# Altium integrated library CbyP.IntLib: 1144 symbols (part 2 of 6) (continued)
## RC0402FR-07470KL
designator R?, comment 470K
62.5mW 470kΩ 50V Thick Film Resistor ±100ppm/℃ ±1% 0402 Chip Resistor - Surface Mount RoHS; Manufacturer: YAGEO; Mfr.Part #: RC0402FR-07470KL; Package: 0402; LCSC Part #: C137976; DigiKey Part Number: 311-470KLRTR-ND; ComponentLink1Description: Link; ComponentLink1URL: https://www.lcsc.com/product-detail/C137976.html?s_z=n_470K; ComponentLink2Description: Link 1; ComponentLink2URL: https://www.digikey.com/en/products/detail/yageo/RC0402FR-07470KL/726618?s=N4IgTCBcDaIEoGEAMAWJYBicC0SDsKeSA0gDIgC6AvkA
footprint RES-0402
pins: 1, 2

## RC0402FR-07475RL
designator R?, comment 475R
62.5mW Thick Film Resistor 50V ±100ppm/℃ ±1% 475Ω 0402 Chip Resistor - Surface Mount ROHS; Manufacturer: YAGEO; Mfr.Part #: RC0402FR-07475RL; Package: 0402; LCSC Part #: C137975; DigiKey Part Number: 311-475LRTR-ND
footprint RES-0402
pins: 1, 2

## RC0402FR-07511KL
designator R?, comment 511K
511kΩ 62.5mW 50V ±100ppm/℃ Thick Film Resistor ±1% 0402 Chip Resistor - Surface Mount ROHS; Manufacturer: YAGEO; Mfr.Part #: RC0402FR-07511KL; Package: 0402; LCSC Part #: C163461; DigiKey Part Number: YAG3176TR-ND
footprint RES-0402
pins: 1, 2

## RC0402FR-07560RL
designator R?, comment 560R
62.5mW 560Ω 50V ±100ppm/℃ Thick Film Resistor ±1% 0402 Chip Resistor - Surface Mount ROHS; Manufacturer: YAGEO; Mfr.Part #: RC0402FR-07560RL; Package: 0402; LCSC Part #: C163460
footprint RES-0402
pins: 1, 2

## RC0402FR-07680RL
designator R?, comment 680R
62.5mW Thick Film Resistors 50V ±100ppm/℃ ±1% 680Ω 0402 Chip Resistor - Surface Mount ROHS; Manufacturer: YAGEO; Mfr.Part #: RC0402FR-07680RL; Package: 0402; LCSC Part #: C137948
footprint RES-0402
pins: 1, 2

## RC0603FR-070RL
designator R?, comment 0R
0Ω 100mW 75V Thick Film Resistor ±1% 0603 Chip Resistor - Surface Mount RoHS; Mfr.Part #: RC0603FR-070RL; Manufacturer: YAGEO; Package: 0603; LCSC Part #: C100044; DigiKey Part Number: 311-0.0HRTR-ND; ComponentLink1Description: Link; ComponentLink1URL: https://www.lcsc.com/product-detail/C100044.html?s_z=n_0R; ComponentLink2Description: Link 1; ComponentLink2URL: https://www.digikey.com/en/products/detail/yageo/RC0603FR-070RL/1304008?s=N4IgTCBcDaIEoGEAMA2JBmAYnAtEg7EnADIgC6AvkA
footprint RES-0603
pins: 1, 2

## RC0603FR-071K5L
designator R?, comment 1.5K
100mW 1.5kΩ 75V Thick Film Resistor ±100ppm/℃ ±1% 0603 Chip Resistor - Surface Mount RoHS; Manufacturer: YAGEO; Mfr.Part #: RC0603FR-071K5L; Package: 0603; LCSC Part #: C114668; DigiKey Part Number: 311-1.50KHRTR-ND; ComponentLink1Description: Link; ComponentLink1URL: https://www.lcsc.com/product-detail/C114668.html?s_z=n_1.5K; ComponentLink2Description: Link 1; ComponentLink2URL: https://www.digikey.com/en/products/detail/yageo/RC0603FR-071K5L/726864?s=N4IgTCBcDaIEoGEAMA2JBmAYnAtEg7AIwDSArADIgC6AvkA
footprint RES-0603
pins: 1, 2

## RC0603FR-071KL
designator R?, comment 1K
100mW 1kΩ 75V Thick Film Resistor ±100ppm/℃ ±1% 0603 Chip Resistor - Surface Mount RoHS; Manufacturer: YAGEO; Mfr.Part #: RC0603FR-071KL; Package: 0603; LCSC Part #: C22548; DigiKey Part Number: 311-1.00KHRTR-ND; ComponentLink1Description: Link; ComponentLink1URL: https://www.lcsc.com/product-detail/C22548.html?s_z=n_C22548; ComponentLink2Description: Link 1; ComponentLink2URL: https://www.digikey.com/en/products/detail/yageo/RC0603FR-071KL/726843?s=N4IgTCBcDaIEoGEAMA2JBmAYnAtEg7AIwDSAMiALoC%2BQA
footprint RES-0603
pins: 1, 2

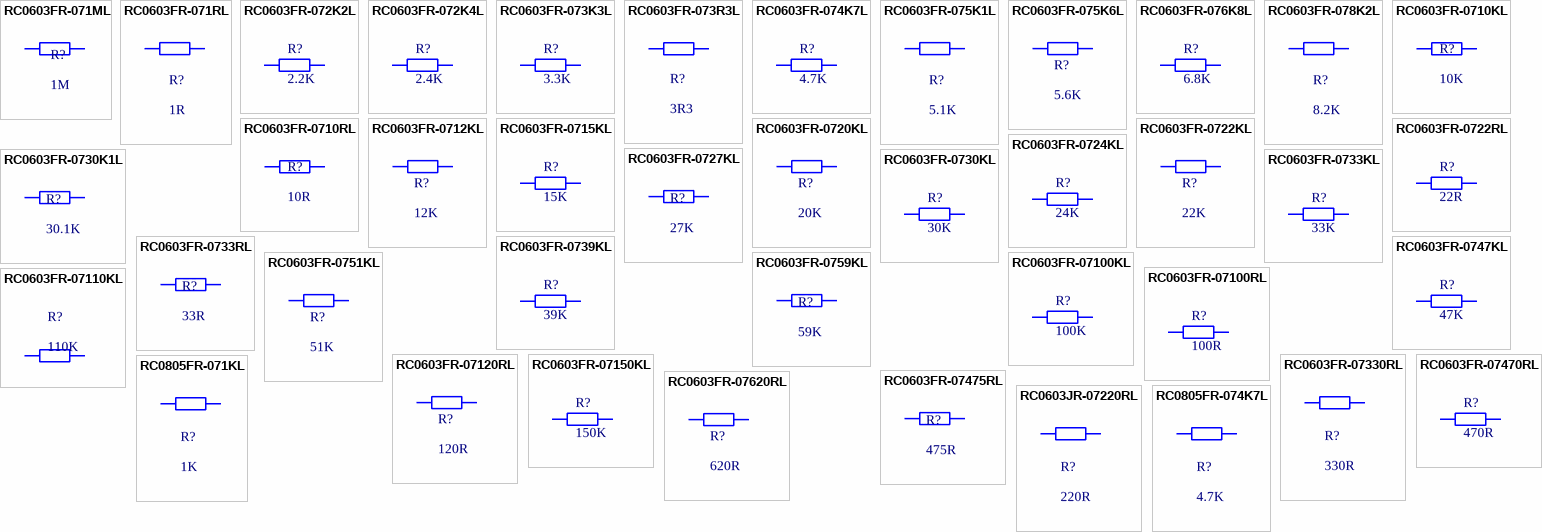
[diagram p11: symbols RC0603FR-071ML to RC0805FR-074K7L]

## RC0603FR-071ML
designator R?, comment 1M
100mW Thick Film Resistors 75V ±100ppm/℃ ±1% 1MΩ 0603 Chip Resistor - Surface Mount ROHS; Manufacturer: YAGEO; Mfr.Part #: RC0603FR-071ML; Package: 0603; LCSC Part #: C105578
footprint RES-0603
pins: 1, 2

## RC0603FR-071RL
designator R?, comment 1R
100mW 1Ω 75V Thick Film Resistor ±1% ±200ppm/℃ 0603 Chip Resistor - Surface Mount RoHS; Manufacturer: YAGEO; Mfr.Part #: RC0603FR-071RL; Package: 0603; LCSC Part #: C112305; DigiKey Part Number: 311-1.00HRTR-ND
footprint RES-0603
pins: 1, 2

## RC0603FR-072K2L
designator R?, comment 2.2K
100mW 2.2kΩ 75V Thick Film Resistor ±100ppm/℃ ±1% 0603 Chip Resistor - Surface Mount RoHS; Manufacturer: YAGEO; Mfr.Part #: RC0603FR-072K2L; Package: 0603; LCSC Part #: C114662; DigiKey Part Number: 311-2.20KHRTR-ND; ComponentLink1Description: Link; ComponentLink1URL: https://www.lcsc.com/product-detail/C114662.html?s_z=n_2.2K; ComponentLink2Description: Link 1; ComponentLink2URL: https://www.digikey.com/en/products/detail/yageo/RC0603FR-072K2L/727016?s=N4IgTCBcDaIEoGEAMA2JBmAYnAtEg7GANJgAyIAugL5A
footprint RES-0603
pins: 1, 2

## RC0603FR-072K4L
designator R?, comment 2.4K
100mW 2.4kΩ 75V Thick Film Resistor ±100ppm/℃ ±1% 0603 Chip Resistor - Surface Mount RoHS; Manufacturer: YAGEO; Mfr.Part #: RC0603FR-072K4L; Package: 0603; LCSC Part #: C114611; DigiKey Part Number: 311-2.40KHRTR-ND; ComponentLink1Description: Link; ComponentLink1URL: https://www.lcsc.com/product-detail/C126359.html?s_z=n_33K; ComponentLink2Description: Link 1; ComponentLink2URL: https://www.digikey.com/en/products/detail/yageo/RC0603FR-072K4L/727023?s=N4IgTCBcDaIEoGEAMA2JBmAYnAtEg7GANIAsAMiALoC%2BQA
footprint RES-0603
pins: 1, 2

## RC0603FR-073K3L
designator R?, comment 3.3K
100mW 3.3kΩ 75V Thick Film Resistor ±100ppm/℃ ±1% 0603 Chip Resistor - Surface Mount RoHS; Manufacturer: YAGEO; Mfr.Part #: RC0603FR-073K3L; Package: 0603; LCSC Part #: C108078; DigiKey Part Number: 311-3.30KHRTR-ND; ComponentLink1Description: Link; ComponentLink1URL: https://www.lcsc.com/product-detail/C108078.html?s_z=n_RC0603FR-073K3L; ComponentLink2Description: Link 1; ComponentLink2URL: https://www.digikey.com/en/products/detail/yageo/RC0603FR-073K3L/727126?s=N4IgTCBcDaIEoGEAMA2JBmAYnAtEg7OgNLoAyIAugL5A
footprint RES-0603
pins: 1, 2

## RC0603FR-073R3L
designator R?, comment 3R3
100mW 3.3Ω 75V Thick Film Resistor ±1% ±200ppm/℃ 0603 Chip Resistor - Surface Mount RoHS; Manufacturer: YAGEO; Mfr.Part #: RC0603FR-073R3L; Package: 0603; LCSC Part #: C137725; DigiKey Part Number: 13-RC0603FR-073R3LTR-ND; ComponentLink1Description: Link; ComponentLink1URL: https://www.lcsc.com/product-detail/C137725.html?s_z=n_RC0603FR-073R3L; ComponentLink2Description: Link 1; ComponentLink2URL: https://www.digikey.com/en/products/detail/yageo/RC0603FR-073R3L/5918348?s=N4IgTCBcDaIEoGEAMA2JBmAYnAtEg7OnOgDIgC6AvkA
footprint RES-0603
pins: 1, 2

## RC0603FR-074K7L
designator R?, comment 4.7K
100mW 4.7kΩ 75V Thick Film Resistor ±100ppm/℃ ±1% 0603 Chip Resistor - Surface Mount RoHS; Manufacturer: YAGEO; Mfr.Part #: RC0603FR-074K7L; Package: 0603; LCSC Part #: C99782; DigiKey Part Number: 311-4.70KHRTR-ND; ComponentLink1Description: Link; ComponentLink1URL: https://www.lcsc.com/product-detail/C99782.html?s_z=n_4.7K; ComponentLink2Description: Link 1; ComponentLink2URL: https://www.digikey.com/en/products/detail/yageo/RC0603FR-074K7L/727212?s=N4IgTCBcDaIEoGEAMA2JBmAYnAtEg7ACwDS%2BAMiALoC%2BQA
footprint RES-0603
pins: 1, 2

## RC0603FR-075K1L
designator R?, comment 5.1K
100mW 5.1kΩ 75V Thick Film Resistor ±100ppm/℃ ±1% 0603 Chip Resistor - Surface Mount RoHS; Manufacturer: YAGEO; Mfr.Part #: RC0603FR-075K1L; Package: 0603; LCSC Part #: C105580; DigiKey Part Number: 311-5.10KHRTR-ND
footprint RES-0603
pins: 1, 2

## RC0603FR-075K6L
designator R?, comment 5.6K
100mW 5.6kΩ 75V Thick Film Resistor ±100ppm/℃ ±1% 0603 Chip Resistor - Surface Mount RoHS; Manufacturer: YAGEO; Mfr.Part #: RC0603FR-075K6L; Package: 0603; LCSC Part #: C114627; DigiKey Part Number: 311-5.60KHRTR-ND; ComponentLink1Description: Link; ComponentLink1URL: https://www.lcsc.com/product-detail/C114627.html?s_z=n_5.6K; ComponentLink2Description: Link 1; ComponentLink2URL: https://www.digikey.com/en/products/detail/yageo/RC0603FR-075K6L/727275?s=N4IgTCBcDaIEoGEAMA2JBmAYnAtEg7AKwDSKAMiALoC%2BQA
footprint RES-0603
pins: 1, 2

## RC0603FR-076K8L
designator R?, comment 6.8K
100mW 6.8kΩ 75V Thick Film Resistor ±100ppm/℃ ±1% 0603 Chip Resistor - Surface Mount RoHS; Manufacturer: YAGEO; Mfr.Part #: RC0603FR-076K8L; Package: 0603; LCSC Part #: C114632; DigiKey Part Number: 311-6.80KHRTR-ND; ComponentLink1Description: Link; ComponentLink1URL: https://www.lcsc.com/product-detail/C114632.html?s_z=n_6.8K; ComponentLink2Description: Link 1; ComponentLink2URL: https://www.digikey.com/en/products/detail/yageo/RC0603FR-076K8L/727323?s=N4IgTCBcDaIEoGEAMA2JBmAYnAtEg7CgNIAcAMiALoC%2BQA
footprint RES-0603
pins: 1, 2

## RC0603FR-078K2L
designator R?, comment 8.2K
100mW 8.2kΩ 75V Thick Film Resistor ±100ppm/℃ ±1% 0603 Chip Resistor - Surface Mount RoHS; Manufacturer: YAGEO; Mfr.Part #: RC0603FR-078K2L; Package: 0603; LCSC Part #: C114637; DigiKey Part Number: 311-8.20KHRTR-ND
footprint RES-0603
pins: 1, 2

## RC0603FR-0710KL
designator R?, comment 10K
100mW 10kΩ 75V Thick Film Resistor ±100ppm/℃ ±1% 0603 Chip Resistor - Surface Mount RoHS; Manufacturer: YAGEO; Mfr.Part #: RC0603FR-0710KL; Package: 0603; LCSC Part #: C98220; DigiKey Part Number: 311-10.0KHRTR-ND; ComponentLink1Description: Link; ComponentLink1URL: https://www.lcsc.com/product-detail/C98220.html?s_z=n_C98220; ComponentLink2Description: Link 1; ComponentLink2URL: https://www.digikey.com/en/products/detail/yageo/RC0603FR-0710KL/726880?s=N4IgTCBcDaIMwEYEFoEAYB0aDSAJASgCr7IByAIiALoC%2BQA
footprint RES-0603
pins: 1, 2

## RC0603FR-0710RL
designator R?, comment 10R
100mW 10Ω 75V Thick Film Resistor ±1% ±200ppm/℃ 0603 Chip Resistor - Surface Mount RoHS; Manufacturer: YAGEO; Mfr.Part #: RC0603FR-0710RL; Package: 0603; LCSC Part #: C109318; DigiKey Part Number: 311-10.0HRTR-ND; ComponentLink1Description: Link; ComponentLink1URL: https://www.lcsc.com/product-detail/C109318.html?s_z=n_10R; ComponentLink2Description: Link 1; ComponentLink2URL: https://www.digikey.com/en/products/detail/yageo/RC0603FR-0710RL/726879?s=N4IgTCBcDaIMwEYEFoEAYB0aASAlAKrsgHIAiIAugL5A
footprint RES-0603
pins: 1, 2

## RC0603FR-0712KL
designator R?, comment 12K
12kΩ 100mW 75V Thick Film Resistor ±100ppm/℃ ±1% 0603 Chip Resistor - Surface Mount RoHS; Manufacturer: YAGEO; Mfr.Part #: RC0603FR-0712KL; Package: 0603; LCSC Part #: C114659; DigiKey Part Number: 311-12.0KHRTR-ND; ComponentLink1Description: Link; ComponentLink1URL: https://www.lcsc.com/product-detail/C114659.html?s_z=n_12K; ComponentLink2Description: Link 1; ComponentLink2URL: https://www.digikey.com/en/products/detail/yageo/RC0603FR-0712KL/726913?s=N4IgTCBcDaIEoGEAMA2JBmAYnAtEg7AIxgDSAMiALoC%2BQA
footprint RES-0603
pins: 1, 2

## RC0603FR-0715KL
designator R?, comment 15K
15kΩ 100mW 75V Thick Film Resistor ±100ppm/℃ ±1% 0603 Chip Resistor - Surface Mount RoHS; Manufacturer: YAGEO; Mfr.Part #: RC0603FR-0715KL; Package: 0603; LCSC Part #: C114661; DigiKey Part Number: 311-15.0KHRTR-ND; ComponentLink1Description: Link; ComponentLink1URL: https://www.lcsc.com/product-detail/C114661.html; ComponentLink2Description: Link 1; ComponentLink2URL: https://www.digikey.com/en/products/detail/yageo/RC0603FR-0715KL/726953?s=N4IgTCBcDaIEoGEAMA2JBmAYnAtEg7AIwCsA0gDIgC6AvkA
footprint RES-0603
pins: 1, 2

## RC0603FR-0720KL
designator R?, comment 20K
100mW 20kΩ 75V Thick Film Resistor ±100ppm/℃ ±1% 0603 Chip Resistor - Surface Mount RoHS; Manufacturer: YAGEO; Mfr.Part #: RC0603FR-0720KL; Package: 0603; LCSC Part #: C105575; DigiKey Part Number: 311-20.0KHRTR-ND; ComponentLink1Description: Link; ComponentLink1URL: https://www.lcsc.com/product-detail/C105575.html?s_z=n_C105575; ComponentLink2Description: Link 1; ComponentLink2URL: https://www.digikey.com/en/products/detail/yageo/RC0603FR-0720KL/727040?s=N4IgTCBcDaIEoGEAMA2JBmAYnAtEg7GEgNIAyIAugL5A
footprint RES-0603
pins: 1, 2

## RC0603FR-0722KL
designator R?, comment 22K
100mW 22kΩ 75V Thick Film Resistor ±100ppm/℃ ±1% 0603 Chip Resistor - Surface Mount RoHS; Manufacturer: YAGEO; Mfr.Part #: RC0603FR-0722KL; Package: 0603; LCSC Part #: C114065; DigiKey Part Number: 311-22.0KHRTR-ND; ComponentLink1Description: Link; ComponentLink1URL: https://www.lcsc.com/product-detail/C114065.html?s_z=n_22K; ComponentLink2Description: Link 1; ComponentLink2URL: https://www.digikey.com/en/products/detail/yageo/RC0603FR-0722KL/727056?s=N4IgTCBcDaIEoGEAMA2JBmAYnAtEg7GGANIAyIAugL5A
footprint RES-0603
pins: 1, 2

## RC0603FR-0722RL
designator R?, comment 22R
22Ω 100mW 75V Thick Film Resistor ±100ppm/℃ ±1% 0603 Chip Resistor - Surface Mount RoHS; Manufacturer: YAGEO; Mfr.Part #: RC0603FR-0722RL; Package: 0603; LCSC Part #: C107701; DigiKey Part Number: 311-22.0HRTR-ND; ComponentLink1Description: Link; ComponentLink1URL: https://www.lcsc.com/product-detail/C107701.html?s_z=n_22R&spm=wm.ssy.bg.2.xh&lcsc_vid=QFJYVlFTFlleVwVeQQMNXlcCTwILBlVVElVeVlQERlYxVlNRQ1FfUV1fQFBaUTsOAxUeFF5JWBYZEEoKFBINSQcJGk4dAgUUFAk%3D; ComponentLink2Description: Link 1; ComponentLink2URL: https://www.digikey.com/en/products/detail/yageo/RC0603FR-0722RL/727055?s=N4IgTCBcDaIEoGEAMA2JBmAYnAtEg7GGHADIgC6AvkA
footprint RES-0603
pins: 1, 2

## RC0603FR-0724KL
designator R?, comment 24K
100mW 24kΩ 75V Thick Film Resistor ±100ppm/℃ ±1% 0603 Chip Resistor - Surface Mount RoHS; Manufacturer: YAGEO; Mfr.Part #: RC0603FR-0724KL; Package: 0603; LCSC Part #: C137760; DigiKey Part Number: 311-24.0KHRTR-ND; ComponentLink1Description: Link; ComponentLink1URL: https://www.lcsc.com/product-detail/C137760.html?s_z=n_24K; ComponentLink2Description: Link 1; ComponentLink2URL: https://www.digikey.com/en/products/detail/yageo/RC0603FR-0724KL/727076?s=N4IgTCBcDaIEoGEAMA2JBmAYnAtEg7GACwDSAMiALoC%2BQA
footprint RES-0603
pins: 1, 2

## RC0603FR-0727KL
designator R?, comment 27K
27kΩ 100mW 75V Thick Film Resistor ±100ppm/℃ ±1% 0603 Chip Resistor - Surface Mount RoHS; Manufacturer: YAGEO; Mfr.Part #: RC0603FR-0727KL; Package: 0603; LCSC Part #: C114614; DigiKey Part Number: 311-27.0KHRTR-ND; ComponentLink1Description: Link; ComponentLink1URL: https://www.lcsc.com/product-detail/C114614.html?s_z=n_27K; ComponentLink2Description: Link 1; ComponentLink2URL: https://www.digikey.com/en/products/detail/yageo/RC0603FR-0727KL/727100?s=N4IgTCBcDaIEoGEAMA2JBmAYnAtEg7GPgNIAyIAugL5A
footprint RES-0603
pins: 1, 2

## RC0603FR-0730K1L
designator R?, comment 30.1K
RES 30.1kΩ ±1% 100mW 0603; Manufacturer: FOJAN; Mfr.Part #: RC0603FR-0730K1L; Package: 0603; LCSC Part #: C137745
footprint RES-0603
pins: 1, 2

## RC0603FR-0730KL
designator R?, comment 30K
100mW 30kΩ 75V Thick Film Resistor ±100ppm/℃ ±1% 0603 Chip Resistor - Surface Mount RoHS; Manufacturer: YAGEO; Mfr.Part #: RC0603FR-0730KL; Package: 0603; LCSC Part #: C100001; DigiKey Part Number: 311-30.0KHRTR-ND; ComponentLink1Description: Link; ComponentLink1URL: https://www.lcsc.com/product-detail/C100001.html?s_z=n_30K; ComponentLink2Description: Link 1; ComponentLink2URL: https://www.digikey.com/en/products/detail/yageo/RC0603FR-0730KL/727140?s=N4IgTCBcDaIEoGEAMA2JBmAYnAtEg7OkgNIAyIAugL5A
footprint RES-0603
pins: 1, 2

## RC0603FR-0733KL
designator R?, comment 33K
100mW 33kΩ 75V Thick Film Resistor ±100ppm/℃ ±1% 0603 Chip Resistor - Surface Mount RoHS; Manufacturer: YAGEO; Mfr.Part #: RC0603FR-0733KL; Package: 0603; LCSC Part #: C126359; DigiKey Part Number: 311-33.0KHRTR-ND; ComponentLink1Description: Link; ComponentLink1URL: https://www.lcsc.com/product-detail/C126359.html?s_z=n_33K; ComponentLink2Description: Link 1; ComponentLink2URL: https://www.digikey.com/en/products/detail/yageo/RC0603FR-0733KL/727159?s=N4IgTCBcDaIEoGEAMA2JBmAYnAtEg7OugNIAyIAugL5A
footprint RES-0603
pins: 1, 2

## RC0603FR-0733RL
designator R?, comment 33R
100mW 33Ω 75V Thick Film Resistor ±100ppm/℃ ±1% 0603 Chip Resistor - Surface Mount RoHS; Manufacturer: YAGEO; Mfr.Part #: RC0603FR-0733RL; Package: 0603; LCSC Part #: C108661; DigiKey Part Number: 13-RC0603FR-0733RLTR-ND; ComponentLink1Description: Link; ComponentLink1URL: https://www.lcsc.com/product-detail/C108661.html?s_z=n_33r; ComponentLink2Description: Link 1; ComponentLink2URL: https://www.digikey.com/en/products/detail/yageo/RC0603FR-0733RL/727158?s=N4IgTCBcDaIEoGEAMA2JBmAYnAtEg7OunADIgC6AvkA
footprint RES-0603
pins: 1, 2

## RC0603FR-0739KL
designator R?, comment 39K
100mW Thick Film Resistors 75V ±100ppm/℃ ±1% 39kΩ 0603 Chip Resistor - Surface Mount ROHS; Manufacturer: YAGEO; Mfr.Part #: RC0603FR-0739KL; Package: 0603
footprint RES-0603
pins: 1, 2

## RC0603FR-0747KL
designator R?, comment 47K
100mW 47kΩ 75V Thick Film Resistor ±100ppm/℃ ±1% 0603 Chip Resistor - Surface Mount RoHS; Manufacturer: YAGEO; Mfr.Part #: RC0603FR-0747KL; Package: 0603; LCSC Part #: C105579; DigiKey Part Number: 311-47.0KHRTR-ND; ComponentLink1Description: Link; ComponentLink1URL: https://www.lcsc.com/product-detail/C105579.html; ComponentLink2Description: Link 1; ComponentLink2URL: https://www.digikey.com/en/products/detail/yageo/RC0603FR-0747KL/727253?s=N4IgTCBcDaIEoGEAMA2JBmAYnAtEg7ACz4DSAMiALoC%2BQA
footprint RES-0603
pins: 1, 2

## RC0603FR-0751KL
designator R?, comment 51K
100mW 51kΩ 75V Thick Film Resistor ±100ppm/℃ ±1% 0603 Chip Resistor - Surface Mount RoHS; Manufacturer: YAGEO; Mfr.Part #: RC0603FR-0751KL; Package: 0603; LCSC Part #: C107231; DigiKey Part Number: 311-51.0KHRTR-ND; ComponentLink1Description: Link; ComponentLink1URL: https://www.lcsc.com/product-detail/C107231.html; ComponentLink2Description: Link 1; ComponentLink2URL: https://www.digikey.com/en/products/detail/yageo/RC0603FR-0751KL/727282?s=N4IgTCBcDaIEoGEAMA2JBmAYnAtEg7AKwCMA0gDIgC6AvkA
footprint RES-0603
pins: 1, 2

## RC0603FR-0759KL
designator R?, comment 59K
100mW Thick Film Resistors 75V ±100ppm/℃ ±1% 59kΩ 0603 Chip Resistor - Surface Mount ROHS; Manufacturer: YAGEO; Mfr.Part #: RC0603FR-0759KL; Package: 0603
footprint RES-0603
pins: 1, 2

## RC0603FR-07100KL
designator R?, comment 100K
100mW 100kΩ 75V Thick Film Resistor ±100ppm/℃ ±1% 0603 Chip Resistor - Surface Mount RoHS; Manufacturer: YAGEO; Mfr.Part #: RC0603FR-07100KL; Package: 0603; LCSC Part #: C14675; DigiKey Part Number: 311-100KHRTR-ND; ComponentLink1Description: Link; ComponentLink1URL: https://www.lcsc.com/product-detail/C14675.html?s_z=n_RC0603FR-07100KL; ComponentLink2Description: Link 1; ComponentLink2URL: https://www.digikey.com/en/products/detail/yageo/RC0603FR-07100KL/726889?s=N4IgTCBcDaIEoGEAMA2JBmAYnAtEg7AIxJIDSAMiALoC%2BQA
footprint RES-0603
pins: 1, 2

## RC0603FR-07100RL
designator R?, comment 100R
RES 100Ω ±1% 100mW 0603; Manufacturer: YAGEO; Mfr.Part #: RC0603FR-07100RL; Package: 0603; LCSC Part #: C105588
footprint RES-0603
pins: 1, 2

## RC0603FR-07110KL
designator R?, comment 110K
110kΩ 100mW 75V Thick Film Resistor ±100ppm/℃ ±1% 0603 Chip Resistor - Surface Mount RoHS; Manufacturer: YAGEO; Mfr.Part #: RC0603FR-07110KL; Package: 0603; LCSC Part #: C137807; DigiKey Part Number: 311-110KHRTR-ND; ComponentLink1Description: Link; ComponentLink1URL: https://www.lcsc.com/product-detail/C137807.html?s_z=n_C137807; ComponentLink2Description: Link 1; ComponentLink2URL: https://www.digikey.com/en/products/detail/yageo/RC0603FR-07110KL/726905?s=N4IgTCBcDaIEoGEAMA2JBmAYnAtEg7AIyFIDSAMiALoC%2BQA
footprint RES-0603
pins: 1, 2

## RC0603FR-07120RL
designator R?, comment 120R
100mW 120Ω 75V Thick Film Resistor ±100ppm/℃ ±1% 0603 Chip Resistor - Surface Mount RoHS; Manufacturer: YAGEO; Mfr.Part #: RC0603FR-07120RL; Package: 0603; LCSC Part #: C114640; DigiKey Part Number: 311-120HRTR-ND; ComponentLink1Description: Link; ComponentLink1URL: https://www.lcsc.com/product-detail/C114640.html?s_z=n_120R; ComponentLink2Description: Link 1; ComponentLink2URL: https://www.digikey.com/en/products/detail/yageo/RC0603FR-07120RL/726920?s=N4IgTCBcDaIEoGEAMA2JBmAYnAtEg7AIxhJwAyIAugL5A
footprint RES-0603
pins: 1, 2

## RC0603FR-07150KL
designator R?, comment 150K
100mW 150kΩ 75V Thick Film Resistor ±100ppm/℃ ±1% 0603 Chip Resistor - Surface Mount RoHS; Manufacturer: YAGEO; Mfr.Part #: RC0603FR-07150KL; Package: 0603; LCSC Part #: C114660; DigiKey Part Number: 311-150KHRTR-ND; ComponentLink1Description: Link; ComponentLink1URL: https://www.lcsc.com/product-detail/C114660.html; ComponentLink2Description: Link 1; ComponentLink2URL: https://www.digikey.com/en/products/detail/yageo/RC0603FR-07150KL/726959?s=N4IgTCBcDaIEoGEAMA2JBmAYnAtEg7AIwCsSA0gDIgC6AvkA
footprint RES-0603
pins: 1, 2

## RC0603FR-07330RL
designator R?, comment 330R
100mW 330Ω 75V Thick Film Resistor ±100ppm/℃ ±1% 0603 Chip Resistor - Surface Mount RoHS; Manufacturer: YAGEO; Mfr.Part #: RC0603FR-07330RL; Package: 0603; LCSC Part #: C105881; DigiKey Part Number: 311-330HRTR-ND
footprint RES-0603
pins: 1, 2

## RC0603FR-07470RL
designator R?, comment 470R
100mW 470Ω 75V Thick Film Resistor ±100ppm/℃ ±1% 0603 Chip Resistor - Surface Mount RoHS; Manufacturer: YAGEO; Mfr.Part #: RC0603FR-07470RL; Package: 0603; LCSC Part #: C114669; DigiKey Part Number: 311-470HRTR-ND; ComponentLink1Description: Link; ComponentLink1URL: https://www.lcsc.com/product-detail/C114669.html?s_z=n_470R; ComponentLink2Description: Link 1; ComponentLink2URL: https://www.digikey.com/en/products/detail/yageo/RC0603FR-072K2L/727016?s=N4IgTCBcDaIEoGEAMA2JBmAYnAtEg7GANJgAyIAugL5A
footprint RES-0603
pins: 1, 2

## RC0603FR-07475RL
designator R?, comment 475R
100mW 475Ω 75V Thick Film Resistor ±100ppm/℃ ±1% 0603 Chip Resistor - Surface Mount RoHS; Manufacturer: YAGEO; Mfr.Part #: RC0603FR-07475RL; Package: 0603; LCSC Part #: C137716; DigiKey Part Number: 311-475HRTR-ND; ComponentLink1Description: Link; ComponentLink1URL: https://www.lcsc.com/product-detail/C137716.html?s_z=n_475R; ComponentLink2Description: Link 1; ComponentLink2URL: https://www.digikey.com/en/products/detail/yageo/RC0603FR-07475RL/727258?s=N4IgTCBcDaIEoGEAMA2JBmAYnAtEg7ACz4CscAMiALoC%2BQA
footprint RES-0603
pins: 1, 2

## RC0603FR-07620RL
designator R?, comment 620R
100mW 51kΩ 75V Thick Film Resistor ±100ppm/℃ ±1% 0603 Chip Resistor - Surface Mount RoHS; Manufacturer: YAGEO; Mfr.Part #: RC0603FR-07620RL; Package: 0603; LCSC Part #: C137695
footprint RES-0603
pins: 1, 2

## RC0603JR-07220RL
designator R?, comment 220R
100mW 220Ω 75V Thick Film Resistor ±100ppm/℃ ±5% 0603 Chip Resistor - Surface Mount RoHS; Manufacturer: YAGEO; Mfr.Part #: RC0603JR-07220RL; Package: 0603; LCSC Part #: C114683; DigiKey Part Number: 311-220GRTR-ND
footprint RES-0603
pins: 1, 2

## RC0805FR-071KL
designator R?, comment 1K
1kΩ 125mW 150V Thick Film Resistor ±100ppm/℃ ±1% 0805 Chip Resistor - Surface Mount RoHS; Manufacturer: YAGEO; Mfr.Part #: RC0805FR-071KL; Package: 0805; LCSC Part #: C95781; DigiKey Part Number: 311-1.00KCRTR-ND
footprint RES-0805-1
footprint RES-0805
pins: 1, 2

## RC0805FR-074K7L
designator R?, comment 4.7K
125mW 4.7kΩ 150V ±100ppm/℃ Thick Film Resistor ±1% 0805 Chip Resistor - Surface Mount RoHS; Manufacturer: YAGEO; Mfr.Part #: RC0805FR-074K7L; Package: 0805; LCSC Part #: C60816; DigiKey Part Number: 311-4.70KCRTR-ND
footprint RES-0805-1
footprint RES-0805
pins: 1, 2

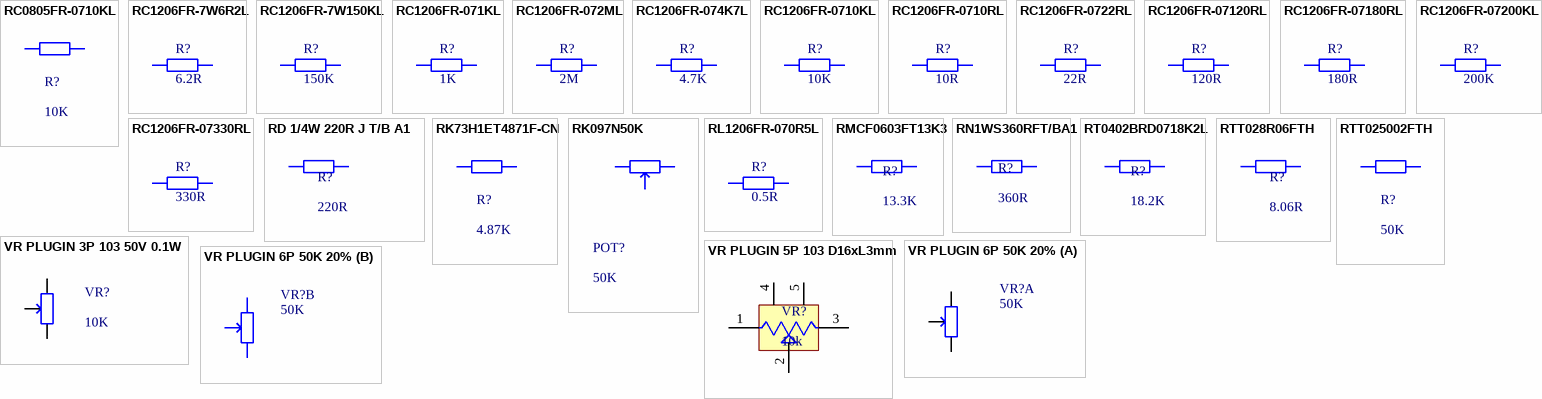
[diagram p12: symbols RC0805FR-0710KL to VR PLUGIN 6P 50K 20%]

## RC0805FR-0710KL
designator R?, comment 10K
125mW 10kΩ 150V ±100ppm/℃ Thick Film Resistor ±1% 0805 Chip Resistor - Surface Mount RoHS; Manufacturer: YAGEO; Mfr.Part #: RC0805FR-0710KL; Package: 0805; LCSC Part #: C84376; DigiKey Part Number: 311-10.0KCRTR-ND
footprint RES-0805-1
footprint RES-0805
pins: 1, 2

## RC1206FR-7W6R2L
designator R?, comment 6.2R
RES 6.2Ω ±1% 0.5W 1206; Manufacturer: YAGEO; Mfr.Part #: RC1206FR-7W6R2L; LCSC Part #: C6379054; Package: 1206
footprint RES-1206
pins: 1, 2

## RC1206FR-7W150KL
designator R?, comment 150K
RES 150kΩ ±1% 0.5W 1206; Manufacturer: YAGEO; Mfr.Part #: RC1206FR-7W150KL; LCSC Part #: C5862493; Package: 1206
footprint RES-1206
pins: 1, 2

## RC1206FR-071KL
designator R?, comment 1K
1kΩ 250mW 200V Thick Film Resistor ±100ppm/℃ ±1% 1206 Chip Resistor - Surface Mount RoHS; Manufacturer: YAGEO; Mfr.Part #: RC1206FR-071KL; LCSC Part #: C131398; Package: 1206; DigiKey Part Number: 311-1.00KFRTR-ND
footprint RES-1206
pins: 1, 2

## RC1206FR-072ML
designator R?, comment 2M
RES 2MΩ ±1% 250mW 1206; Manufacturer: YAGEO; Mfr.Part #: RC1206FR-072ML; LCSC Part #: C137328; Package: 1206
footprint RES-1206
pins: 1, 2

## RC1206FR-074K7L
designator R?, comment 4.7K
4.7kΩ 250mW 200V Thick Film Resistor ±100ppm/℃ ±1% 1206 Chip Resistor - Surface Mount RoHS; Manufacturer: YAGEO; Mfr.Part #: RC1206FR-074K7L; Package: 1206; LCSC Part #: C137262; DigiKey Part Number: 311-4.70KFRTR-ND
footprint RES-1206
pins: 1, 2